# Altium footprint library RLC.PcbLib: 326 footprints (part 11 of 21)
Each footprint in its own frame and in the unit in brackets; x right, y up, seen from the top. Pads: shape width x height; smd on the part's side, far side on the other; paste and mask are expansions set on the pad; w line width, h text height; cw(c..) or ccw(c..) is an arc to the next point about the centre after c.
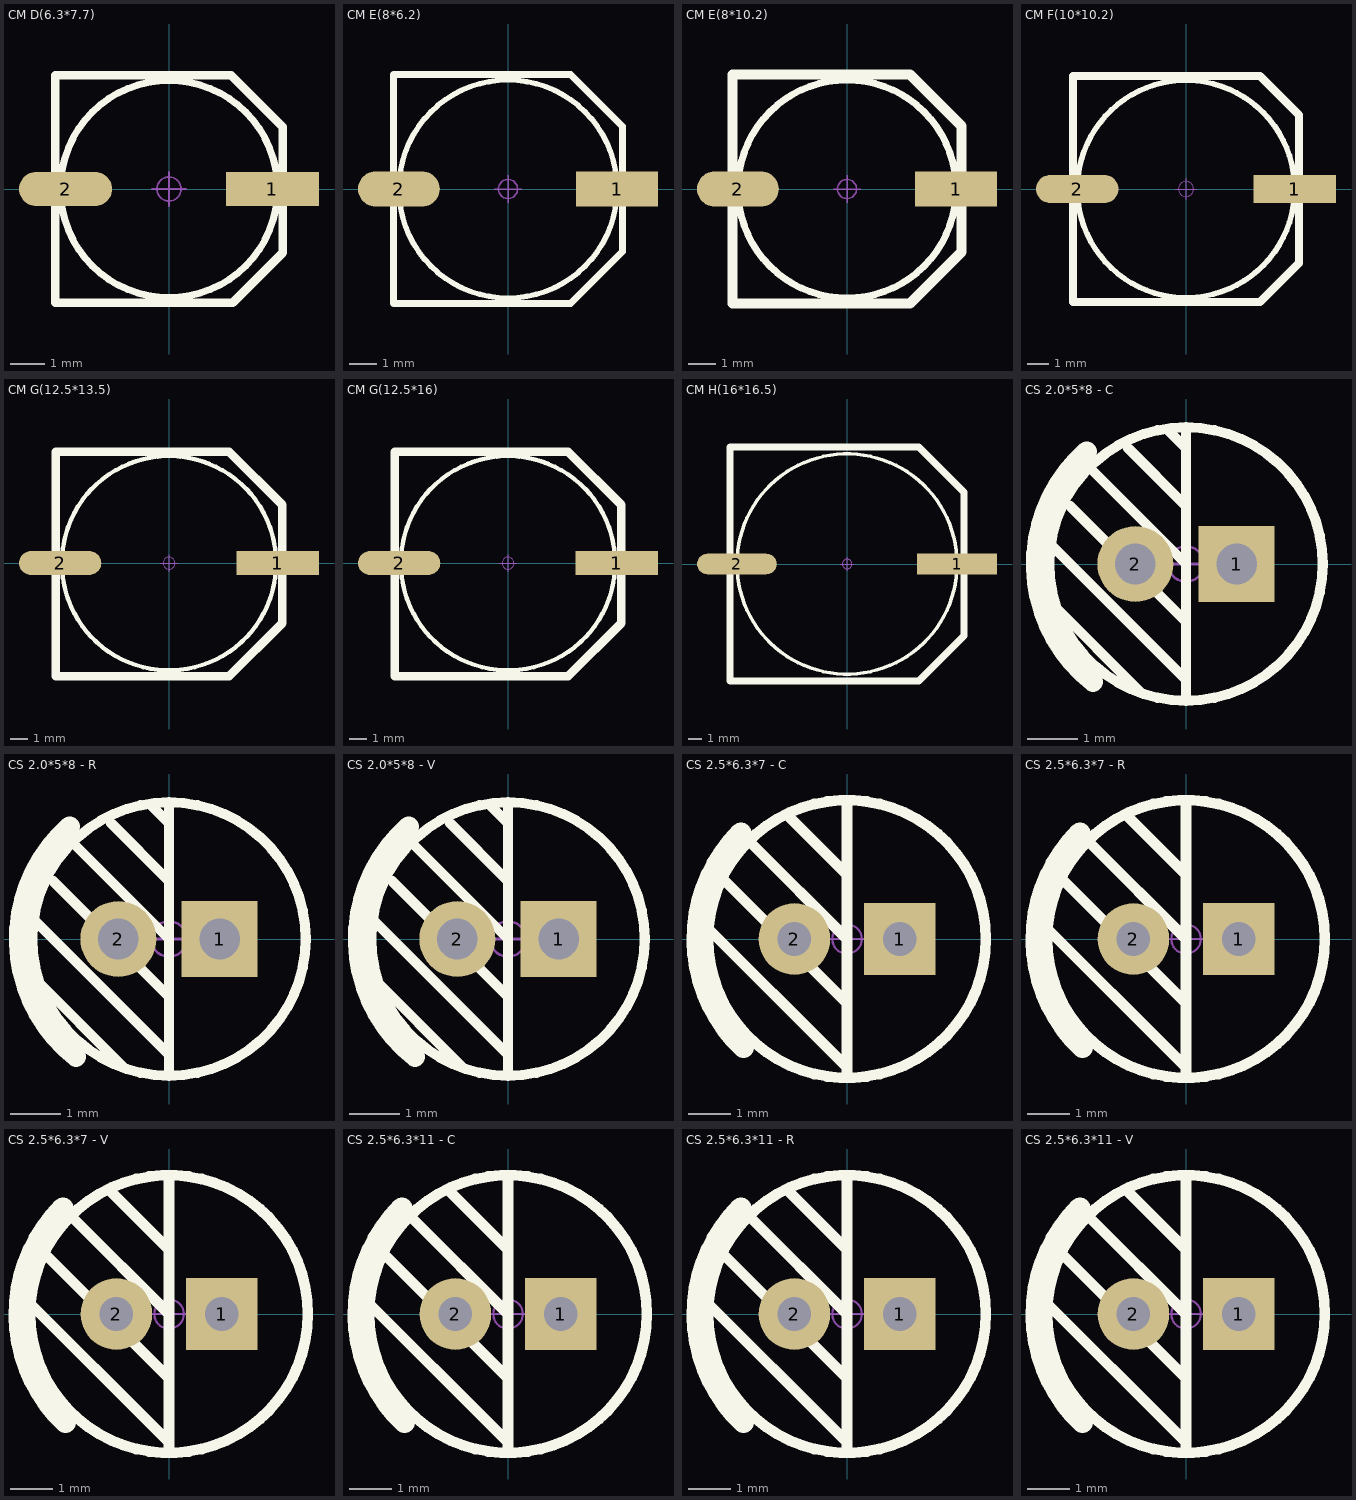
[diagram p10: the footprints below, top view; thin cyan lines are the x and y axes]

## CM D(6.3*7.7) [mm] "��Ƭ�����ݣ�ֱ��6.3mm����7.7mm         �Ա�ID:�ƾ���ʯ"
pads (2):
  rect 2.7x1 smd: 1(3,0)
  oval 2.7x1 smd: 2(-3,0)
Top Overlay:
  circle w0.2: c0,0 r3.15
  lines w0.254: -3.3,-3.3 1.85,-3.3 3.3,-1.85 3.3,1.8 1.8,3.3 -3.3,3.3 -3.3,-3.3
Mechanical 15:
  circle w0.05: c0,0 r0.35
  lines w0.05: -0.5,0 0.5,0 ; 0,-0.5 0,0.5
3D body "CM D(6.3X7.7).STEP": height 7.7, standoff -0.01, extent -3.5,-3.3 3.5,3.3

## CM E(8*6.2) [mm] "��Ƭ�����ݣ�ֱ��8mm����6.2mm        �Ա�ID:�ƾ���ʯ"
pads (2):
  rect 3x1.3 smd: 1(4,0)
  oval 3x1.3 smd: 2(-4,0)
Top Overlay:
  circle w0.2: c0,0 r4
  lines w0.254: -4.2,-4.2 2.3,-4.2 4.2,-2.3 4.2,2.3 2.3,4.2 -4.2,4.2 -4.2,-4.2
Mechanical 15:
  circle w0.05: c0,0 r0.35
  lines w0.05: -0.5,0 0.5,0 ; 0,-0.5 0,0.5
3D body "CM E(8X6.2).STEP": height 6.2, standoff -0.01, extent -4.5,-4.15 4.5,4.15

## CM E(8*10.2) [mm] "��Ƭ�����ݣ�ֱ��8mm����10.2mm        �Ա�ID:�ƾ���ʯ"
pads (2):
  rect 3x1.3 smd: 1(4,0)
  oval 3x1.3 smd: 2(-4,0)
Top Overlay:
  circle w0.254: c0,0 r4
  lines w0.381: -4.2,-4.2 -4.2,4.2 2.3,4.2 4.2,2.3 4.2,-2.3 2.3,-4.2 -4.2,-4.2
Mechanical 15:
  circle w0.05: c0,0 r0.35
  lines w0.05: -0.5,0 0.5,0 ; 0,-0.5 0,0.5
3D body "CM E(8X10.2).STEP": height 10.2, standoff -0.01, extent -4.5,-4.15 4.5,4.15

## CM F(10*10.2) [mm] "��Ƭ�����ݣ�ֱ��10mm����10.2mm    �Ա�ID:�ƾ���ʯ"
pads (2):
  rect 3.8x1.3 smd: 1(5,0)
  oval 3.8x1.3 smd: 2(-5,0)
Top Overlay:
  circle w0.254: c0,0 r5
  lines w0.381: 5.191,-3.413 3.404,-5.2 -5.2,-5.2 -5.2,5.2 3.404,5.2 5.2,3.404 5.2,-3.404
Mechanical 15:
  circle w0.05: c0,0 r0.35
  lines w0.05: -0.5,0 0.5,0 ; 0,-0.5 0,0.5
3D body "CM F(10X10.2).STEP": height 10.2, standoff -0.01, extent -5.8,-5.15 5.8,5.15

## CM G(12.5*13.5) [mm] "��Ƭ�����ݣ�ֱ��12.5mm����13.5mm        �Ա�ID:�ƾ���ʯ"
pads (2):
  rect 4.8x1.4 smd: 1(6.35,0)
  oval 4.8x1.4 smd: 2(-6.35,0)
Top Overlay:
  circle w0.254: c0,0 r6.25
  lines w0.508: -6.6,-6.6 -6.6,6.5 3.5,6.5 6.6,3.4 6.6,-3.5 3.5,-6.6 -6.6,-6.6
Mechanical 15:
  circle w0.05: c0,0 r0.35
  lines w0.05: -0.5,0 0.5,0 ; 0,-0.5 0,0.5
3D body "CM G(12.5X13.5).STEP": height 13.5, standoff -0.01, extent -7.15,-6.5 7.15,6.5

## CM G(12.5*16) [mm] "��Ƭ�����ݣ�ֱ��12.5mm����16mm         �Ա�ID:�ƾ���ʯ"
pads (2):
  rect 4.8x1.4 smd: 1(6.35,0)
  oval 4.8x1.4 smd: 2(-6.35,0)
Top Overlay:
  circle w0.254: c0,0 r6.25
  lines w0.508: -6.6,-6.6 -6.6,6.5 3.5,6.5 6.6,3.4 6.6,-3.5 3.5,-6.6 -6.6,-6.6
Mechanical 15:
  circle w0.05: c0,0 r0.35
  lines w0.05: -0.5,0 0.5,0 ; 0,-0.5 0,0.5
3D body "CM G(12.5X16).STEP": height 16, standoff -0.01, extent -7.15,-6.5 7.15,6.5

## CM H(16*16.5) [mm] "��Ƭ�����ݣ�ֱ��16mm����16.5mm"
pads (2):
  rect 5.8x1.5 smd: 1(8.001,0)
  oval 5.8x1.5 smd: 2(-8.001,0)
Top Overlay:
  circle w0.254: c0,0 r8
  lines w0.508: -8.5,-8.5 -8.5,8.5 5.216,8.5 8.5,5.216 8.5,-5.216 5.216,-8.5 -8.5,-8.5
Mechanical 15:
  circle w0.05: c0,0 r0.35
  lines w0.05: -0.5,0 0.5,0 ; 0,-0.5 0,0.5
3D body "CM H(16X16.5).STEP": height 16.5, standoff -0.01, extent -9.4,-8.5 9.4,8.5

## CS 2.0*5*8 - C [mm] "�ž�2mm , ֱ��5mm , ��8mm"
pads (2):
  rect 1.5x1.5 hole 0.8: 1(1,0)
  round 1.5 hole 0.8: 2(-1,0)
Top Overlay:
  circle w0.2: c0,0 r2.7
  lines w0.2: -2.667,-0.762 -0.889,-2.54 ; -2.667,0.381 0,-2.286 ; -2.286,1.143 0,-1.143 ; -1.905,1.905 0,0 ; -1.143,2.286 0,1.143 ; -0.381,2.667 0,2.286 ; 0,-2.667 0,2.667
  lines w0.4: -1.96,2.221 ccw(c0,0) -1.835,-2.325
Mechanical 15:
  circle w0.05: c0,0 r0.35
  lines w0.05: -0.5,0 0.5,0 ; 0,-0.5 0,0.5
3D body "CS 5X8.STEP": height 8.02, standoff -3.48, extent -2.5,-2.5 2.5,2.5

## CS 2.0*5*8 - R [mm] "�ž�2mm , ֱ��5mm , ��8mm                    �Ա�ID:�ƾ���ʯ"
pads (2):
  rect 1.5x1.5 hole 0.8: 1(1,0)
  round 1.5 hole 0.8: 2(-1,0)
Top Overlay:
  circle w0.2: c0,0 r2.7
  lines w0.2: -2.667,-0.762 -0.889,-2.54 ; -2.667,0.381 0,-2.286 ; -2.286,1.143 0,-1.143 ; -1.905,1.905 0,0 ; -1.143,2.286 0,1.143 ; -0.381,2.667 0,2.286 ; 0,-2.667 0,2.667
  lines w0.4: -1.96,2.221 ccw(c0,0) -1.835,-2.325
Mechanical 15:
  circle w0.05: c0,0 r0.35
  lines w0.05: -0.5,0 0.5,0 ; 0,-0.5 0,0.5
3D body "CS 5X8.STEP": height 8.02, standoff -3.48, extent -2.5,-2.5 2.5,2.5

## CS 2.0*5*8 - V [mm] "�ž�2mm , ֱ��5mm , ��8mm                   �Ա�ID:�ƾ���ʯ"
pads (2):
  rect 1.5x1.5 hole 0.8: 1(1,0)
  round 1.5 hole 0.8: 2(-1,0)
Top Overlay:
  circle w0.2: c0,0 r2.7
  lines w0.2: -2.667,-0.762 -0.889,-2.54 ; -2.667,0.381 0,-2.286 ; -2.286,1.143 0,-1.143 ; -1.905,1.905 0,0 ; -1.143,2.286 0,1.143 ; -0.381,2.667 0,2.286 ; 0,-2.667 0,2.667
  lines w0.4: -1.96,2.221 ccw(c0,0) -1.835,-2.325
Mechanical 15:
  circle w0.05: c0,0 r0.35
  lines w0.05: -0.5,0 0.5,0 ; 0,-0.5 0,0.5
3D body "CS 5X8.STEP": height 8.02, standoff -3.48, extent -2.5,-2.5 2.5,2.5

## CS 2.5*6.3*7 - C [mm] "�ž�2.5mm , ֱ��6.3mm , ��7mm                �Ա�ID:�ƾ���ʯ"
pads (2):
  rect 1.7x1.7 hole 0.8: 1(1.25,0)
  round 1.7 hole 0.8: 2(-1.25,0)
Top Overlay:
  circle w0.254: c0,0 r3.3
  lines w0.254: -3.556,0.508 0,-3.048 ; -3.048,1.524 0,-1.524 ; -2.286,2.286 0,0 ; -1.397,2.921 0,1.524 ; 0,-3.15 0,3.15
  lines w0.504: -2.521,2.521 ccw(c0,0) -2.459,-2.582
Mechanical 15:
  circle w0.05: c0,0 r0.35
  lines w0.05: -0.5,0 0.5,0 ; 0,-0.5 0,0.5
3D body "CS 6.3X7.STEP": height 7.02, standoff -3.48, extent -3.15,-3.15 3.15,3.15

## CS 2.5*6.3*7 - R [mm] "�ž�2.5mm , ֱ��6.3mm , ��7mm           �Ա�ID:�ƾ���ʯ"
pads (2):
  rect 1.7x1.7 hole 0.8: 1(1.25,0)
  round 1.7 hole 0.8: 2(-1.25,0)
Top Overlay:
  circle w0.254: c0,0 r3.3
  lines w0.254: -3.556,0.508 0,-3.048 ; -3.048,1.524 0,-1.524 ; -2.286,2.286 0,0 ; -1.397,2.921 0,1.524 ; 0,-3.15 0,3.15
  lines w0.504: -2.521,2.521 ccw(c0,0) -2.459,-2.582
Mechanical 15:
  circle w0.05: c0,0 r0.35
  lines w0.05: -0.5,0 0.5,0 ; 0,-0.5 0,0.5
3D body "CS 6.3X7.STEP": height 7.02, standoff -3.48, extent -3.15,-3.15 3.15,3.15

## CS 2.5*6.3*7 - V [mm] "�ž�2.5mm , ֱ��6.3mm , ��7mm"
pads (2):
  rect 1.7x1.7 hole 0.8: 1(1.25,0)
  round 1.7 hole 0.8: 2(-1.25,0)
Top Overlay:
  circle w0.254: c0,0 r3.3
  lines w0.254: -3.556,0.508 0,-3.048 ; -3.048,1.524 0,-1.524 ; -2.286,2.286 0,0 ; -1.397,2.921 0,1.524 ; 0,-3.15 0,3.15
  lines w0.504: -2.521,2.521 ccw(c0,0) -2.459,-2.582
Mechanical 15:
  circle w0.05: c0,0 r0.35
  lines w0.05: -0.5,0 0.5,0 ; 0,-0.5 0,0.5
3D body "CS 6.3X7.STEP": height 7, standoff -3.5, extent -3.15,-3.15 3.15,3.15

## CS 2.5*6.3*11 - C [mm] "�ž�2.5mm , ֱ��6.3mm , ��11mm                  �Ա�ID:�ƾ���ʯ"
pads (2):
  rect 1.7x1.7 hole 0.8: 1(1.25,0)
  round 1.7 hole 0.8: 2(-1.25,0)
Top Overlay:
  circle w0.254: c0,0 r3.3
  lines w0.254: -3.556,0.508 0,-3.048 ; -3.048,1.524 0,-1.524 ; -2.286,2.286 0,0 ; -1.397,2.921 0,1.524 ; 0,-3.15 0,3.15
  lines w0.504: -2.521,2.521 ccw(c0,0) -2.459,-2.582
Mechanical 15:
  circle w0.05: c0,0 r0.35
  lines w0.05: -0.5,0 0.5,0 ; 0,-0.5 0,0.5
3D body "CS 6.3X11.STEP": height 11.02, standoff -3.48, extent -3.15,-3.15 3.15,3.15

## CS 2.5*6.3*11 - R [mm] "�ž�2.5mm , ֱ��6.3mm , ��11mm            �Ա�ID:�ƾ���ʯ"
pads (2):
  rect 1.7x1.7 hole 0.8: 1(1.25,0)
  round 1.7 hole 0.8: 2(-1.25,0)
Top Overlay:
  circle w0.254: c0,0 r3.3
  lines w0.254: -3.556,0.508 0,-3.048 ; -3.048,1.524 0,-1.524 ; -2.286,2.286 0,0 ; -1.397,2.921 0,1.524 ; 0,-3.15 0,3.15
  lines w0.504: -2.521,2.521 ccw(c0,0) -2.459,-2.582
Mechanical 15:
  circle w0.05: c0,0 r0.35
  lines w0.05: -0.5,0 0.5,0 ; 0,-0.5 0,0.5
3D body "CS 6.3X11.STEP": height 11.02, standoff -3.48, extent -3.15,-3.15 3.15,3.15

## CS 2.5*6.3*11 - V [mm] "�ž�2.5mm , ֱ��6.3mm , ��11mm                   �Ա�ID:�ƾ���ʯ"
pads (2):
  rect 1.7x1.7 hole 0.8: 1(1.25,0)
  round 1.7 hole 0.8: 2(-1.25,0)
Top Overlay:
  circle w0.254: c0,0 r3.3
  lines w0.254: -3.556,0.508 0,-3.048 ; -3.048,1.524 0,-1.524 ; -2.286,2.286 0,0 ; -1.397,2.921 0,1.524 ; 0,-3.15 0,3.15
  lines w0.504: -2.521,2.521 ccw(c0,0) -2.459,-2.582
Mechanical 15:
  circle w0.05: c0,0 r0.35
  lines w0.05: -0.5,0 0.5,0 ; 0,-0.5 0,0.5
3D body "CS 6.3X11.STEP": height 11.02, standoff -3.48, extent -3.15,-3.15 3.15,3.15